# Altium footprint library ref-packages.PCBLIB: 1543 footprints (part 42 of 103)
Each footprint in its own frame and in the unit in brackets; x right, y up, seen from the top. Pads: shape width x height; smd on the part's side, far side on the other; paste and mask are expansions set on the pad; w line width, h text height; cw(c..) or ccw(c..) is an arc to the next point about the centre after c.
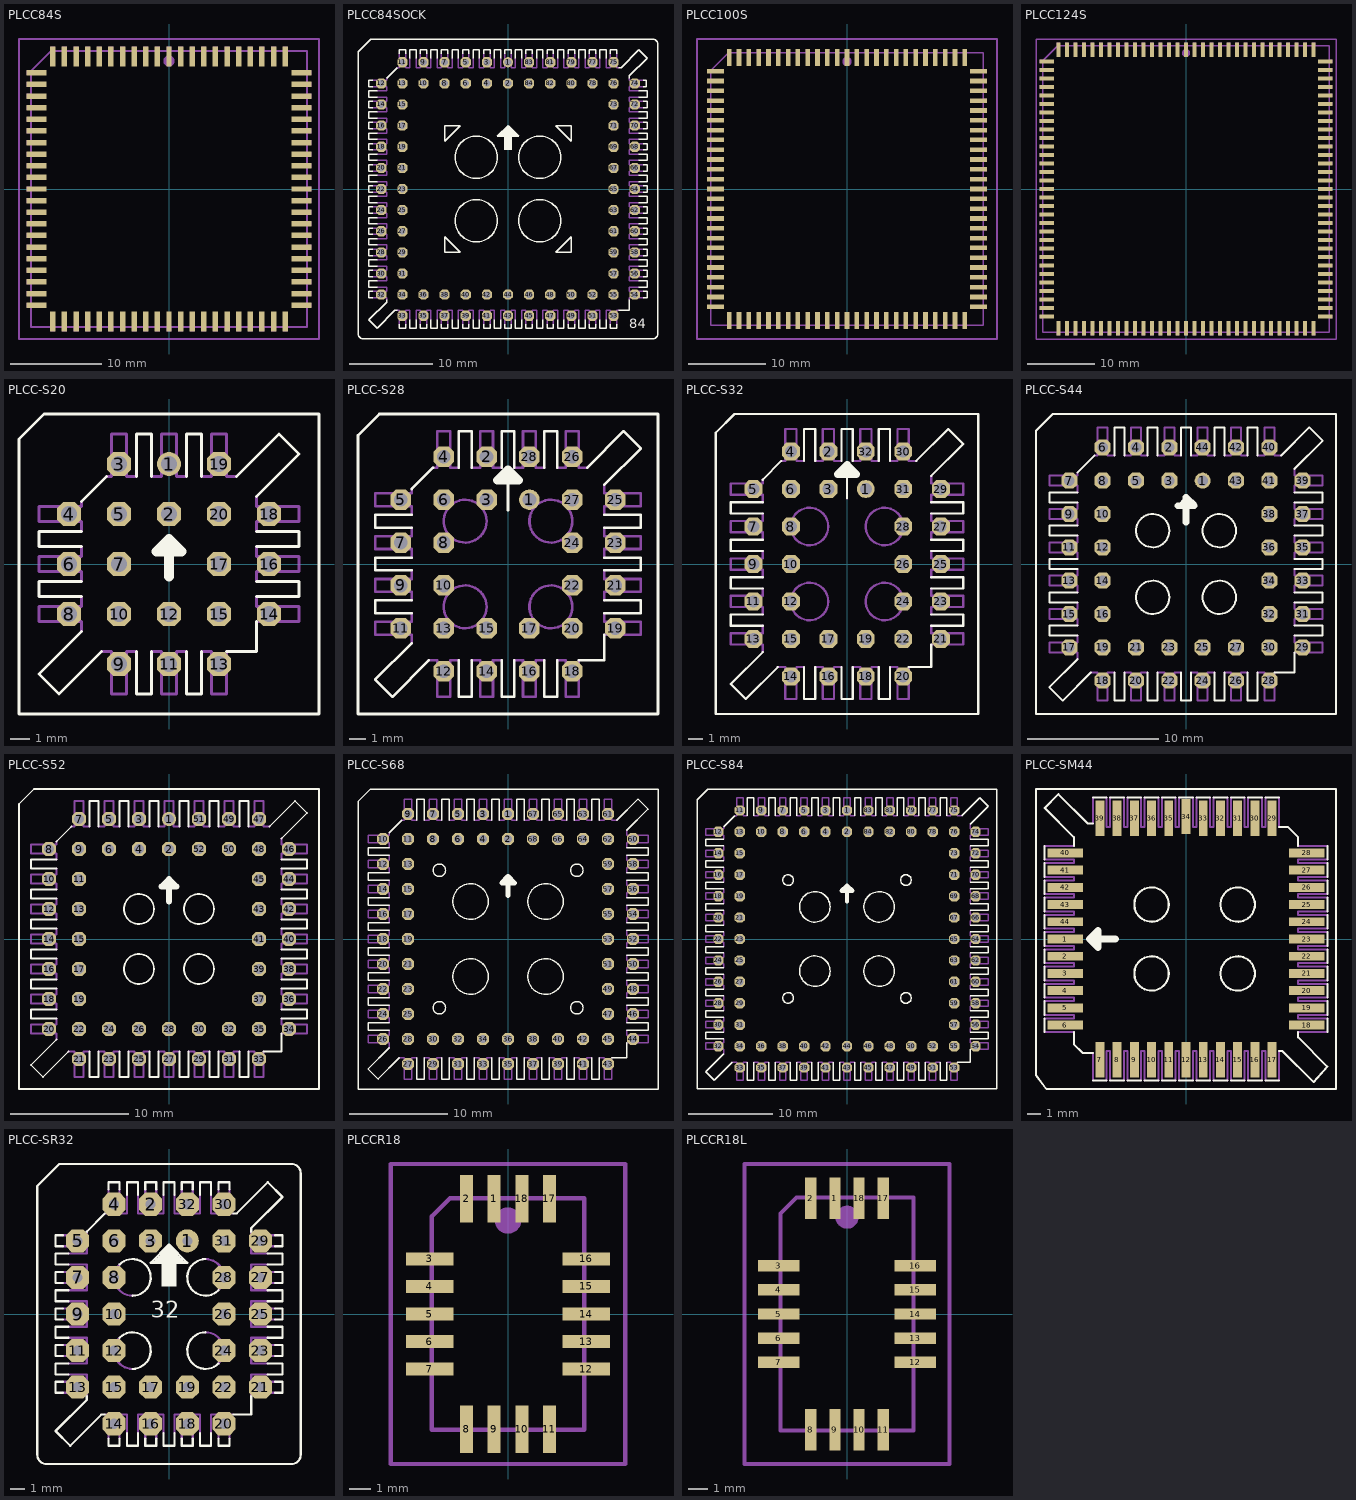
[diagram p41: the footprints below, top view; thin cyan lines are the x and y axes]

## PLCC84S [mil]
pads (84):
  rect 23.62x86.61 smd: 1(0,570.87) 2(-50,570.87) 3(-100,570.87) 4(-150,570.87) 5(-200,570.87) 6(-250,570.87) 7(-300,570.87) 8(-350,570.87) 9(-400,570.87) 10(-450,570.87) 11(-500,570.87) 33(-500,-570.87) 34(-450,-570.87) 35(-400,-570.87) 36(-350,-570.87) 37(-300,-570.87) 38(-250,-570.87) 39(-200,-570.87) 40(-150,-570.87) 41(-100,-570.87) 42(-50,-570.87) 43(0,-570.87) 44(50,-570.87) 45(100,-570.87) 46(150,-570.87) 47(200,-570.87) 48(250,-570.87) 49(300,-570.87) 50(350,-570.87) 51(400,-570.87) 52(450,-570.87) 53(500,-570.87) 75(500,570.87) 76(450,570.87) 77(400,570.87) 78(350,570.87) 79(300,570.87) 80(250,570.87) 81(200,570.87) 82(150,570.87) 83(100,570.87) 84(50,570.87)
  rect 86.61x23.62 smd: 12(-570.87,500) 13(-570.87,450) 14(-570.87,400) 15(-570.87,350) 16(-570.87,300) 17(-570.87,250) 18(-570.87,200) 19(-570.87,150) 20(-570.87,100) 21(-570.87,50) 22(-570.87,0) 23(-570.87,-50) 24(-570.87,-100) 25(-570.87,-150) 26(-570.87,-200) 27(-570.87,-250) 28(-570.87,-300) 29(-570.87,-350) 30(-570.87,-400) 31(-570.87,-450) 32(-570.87,-500) 54(570.87,-500) 55(570.87,-450) 56(570.87,-400) 57(570.87,-350) 58(570.87,-300) 59(570.87,-250) 60(570.87,-200) 61(570.87,-150) 62(570.87,-100) 63(570.87,-50) 64(570.87,0) 65(570.87,50) 66(570.87,100) 67(570.87,150) 68(570.87,200) 69(570.87,250) 70(570.87,300) 71(570.87,350) 72(570.87,400) 73(570.87,450) 74(570.87,500)
Mechanical 16:
  circle w24: c0,551.18 r11.81
  rectangle: -10.24,596.46 10.24,614.17
  rectangle: -60.24,596.46 -39.76,614.17
  rectangle: -110.24,596.46 -89.76,614.17
  rectangle: -160.24,596.46 -139.76,614.17
  rectangle: -210.24,596.46 -189.76,614.17
  rectangle: -260.24,596.46 -239.76,614.17
  rectangle: -310.24,596.46 -289.76,614.17
  rectangle: -360.24,596.46 -339.76,614.17
  rectangle: -410.24,596.46 -389.76,614.17
  rectangle: -460.24,596.46 -439.76,614.17
  rectangle: -510.24,596.46 -489.76,614.17
  rectangle: -614.17,489.76 -596.46,510.24
  rectangle: -614.17,439.76 -596.46,460.24
  rectangle: -614.17,389.76 -596.46,410.24
  rectangle: -614.17,339.76 -596.46,360.24
  rectangle: -614.17,289.76 -596.46,310.24
  rectangle: -614.17,239.76 -596.46,260.24
  rectangle: -614.17,189.76 -596.46,210.24
  rectangle: -614.17,139.76 -596.46,160.24
  rectangle: -614.17,89.76 -596.46,110.24
  rectangle: -614.17,39.76 -596.46,60.24
  rectangle: -614.17,-10.24 -596.46,10.24
  rectangle: -614.17,-60.24 -596.46,-39.76
  rectangle: -614.17,-110.24 -596.46,-89.76
  rectangle: -614.17,-160.24 -596.46,-139.76
  rectangle: -614.17,-210.24 -596.46,-189.76
  rectangle: -614.17,-260.24 -596.46,-239.76
  rectangle: -614.17,-310.24 -596.46,-289.76
  rectangle: -614.17,-360.24 -596.46,-339.76
  rectangle: -614.17,-410.24 -596.46,-389.76
  rectangle: -614.17,-460.24 -596.46,-439.76
  rectangle: -614.17,-510.24 -596.46,-489.76
  rectangle: -510.24,-614.17 -489.76,-596.46
  rectangle: -460.24,-614.17 -439.76,-596.46
  rectangle: -410.24,-614.17 -389.76,-596.46
  rectangle: -360.24,-614.17 -339.76,-596.46
  rectangle: -310.24,-614.17 -289.76,-596.46
  rectangle: -260.24,-614.17 -239.76,-596.46
  rectangle: -210.24,-614.17 -189.76,-596.46
  rectangle: -160.24,-614.17 -139.76,-596.46
  rectangle: -110.24,-614.17 -89.76,-596.46
  rectangle: -60.24,-614.17 -39.76,-596.46
  rectangle: -10.24,-614.17 10.24,-596.46
  rectangle: 39.76,-614.17 60.24,-596.46
  rectangle: 89.76,-614.17 110.24,-596.46
  rectangle: 139.76,-614.17 160.24,-596.46
  rectangle: 189.76,-614.17 210.24,-596.46
  rectangle: 239.76,-614.17 260.24,-596.46
  rectangle: 289.76,-614.17 310.24,-596.46
  rectangle: 339.76,-614.17 360.24,-596.46
  rectangle: 389.76,-614.17 410.24,-596.46
  rectangle: 439.76,-614.17 460.24,-596.46
  rectangle: 489.76,-614.17 510.24,-596.46
  rectangle: 596.46,-510.24 614.17,-489.76
  rectangle: 596.46,-460.24 614.17,-439.76
  rectangle: 596.46,-410.24 614.17,-389.76
  rectangle: 596.46,-360.24 614.17,-339.76
  rectangle: 596.46,-310.24 614.17,-289.76
  rectangle: 596.46,-260.24 614.17,-239.76
  rectangle: 596.46,-210.24 614.17,-189.76
  rectangle: 596.46,-160.24 614.17,-139.76
  rectangle: 596.46,-110.24 614.17,-89.76
  rectangle: 596.46,-60.24 614.17,-39.76
  rectangle: 596.46,-10.24 614.17,10.24
  rectangle: 596.46,39.76 614.17,60.24
  rectangle: 596.46,89.76 614.17,110.24
  rectangle: 596.46,139.76 614.17,160.24
  rectangle: 596.46,189.76 614.17,210.24
  rectangle: 596.46,239.76 614.17,260.24
  rectangle: 596.46,289.76 614.17,310.24
  rectangle: 596.46,339.76 614.17,360.24
  rectangle: 596.46,389.76 614.17,410.24
  rectangle: 596.46,439.76 614.17,460.24
  rectangle: 596.46,489.76 614.17,510.24
  rectangle: 489.76,596.46 510.24,614.17
  rectangle: 439.76,596.46 460.24,614.17
  rectangle: 389.76,596.46 410.24,614.17
  rectangle: 339.76,596.46 360.24,614.17
  rectangle: 289.76,596.46 310.24,614.17
  rectangle: 239.76,596.46 260.24,614.17
  rectangle: 189.76,596.46 210.24,614.17
  rectangle: 139.76,596.46 160.24,614.17
  rectangle: 89.76,596.46 110.24,614.17
  rectangle: 39.76,596.46 60.24,614.17
  lines w8: -594.49,-594.49 -594.49,506.5 -506.5,594.49 594.49,594.49 594.49,-594.49 -594.49,-594.49
Mechanical 27:
  lines w7.87: -645.79,-645.79 645.79,-645.79 645.79,645.79 -645.79,645.79 -645.79,-645.79

## PLCC84SOCK [mil]
pads (84):
  round 48 hole 32: 1(0,600)
  oct 48x48 hole 32: 2(0,500) 3(-100,600) 4(-100,500) 5(-200,600) 6(-200,500) 7(-300,600) 8(-300,500) 9(-400,600) 10(-400,500) 11(-500,600) 12(-600,500) 13(-500,500) 14(-600,400) 15(-500,400) 16(-600,300) 17(-500,300) 18(-600,200) 19(-500,200) 20(-600,100) 21(-500,100) 22(-600,0) 23(-500,0) 24(-600,-100) 25(-500,-100) 26(-600,-200) 27(-500,-200) 28(-600,-300) 29(-500,-300) 30(-600,-400) 31(-500,-400) 32(-600,-500) 33(-500,-600) 34(-500,-500) 35(-400,-600) 36(-400,-500) 37(-300,-600) 38(-300,-500) 39(-200,-600) 40(-200,-500) 41(-100,-600) 42(-100,-500) 43(0,-600) 44(0,-500) 45(100,-600) 46(100,-500) 47(200,-600) 48(200,-500) 49(300,-600) 50(300,-500) 51(400,-600) 52(400,-500) 53(500,-600) 54(600,-500) 55(500,-500) 56(600,-400) 57(500,-400) 58(600,-300) 59(500,-300) 60(600,-200) 61(500,-200) 62(600,-100) 63(500,-100) 64(600,0) 65(500,0) 66(600,100) 67(500,100) 68(600,200) 69(500,200) 70(600,300) 71(500,300) 72(600,400) 73(500,400) 74(600,500) 75(500,600) 76(500,500) 77(400,600) 78(400,500) 79(300,600) 80(300,500) 81(200,600) 82(200,500) 83(100,600) 84(100,500)
Top Overlay:
  drawing of 307 lines, arcs and shapes, not listed
  text "84" at 575,-675 h77.5
Mechanical 16:
  drawing of 256 lines, arcs and shapes, not listed

## PLCC100S [mil]
pads (100):
  rect 23.62x86.61 smd: 1(0,669.29) 2(-50,669.29) 3(-100,669.29) 4(-150,669.29) 5(-200,669.29) 6(-250,669.29) 7(-300,669.29) 8(-350,669.29) 9(-400,669.29) 10(-450,669.29) 11(-500,669.29) 12(-550,669.29) 13(-600,669.29) 39(-600,-669.29) 40(-550,-669.29) 41(-500,-669.29) 42(-450,-669.29) 43(-400,-669.29) 44(-350,-669.29) 45(-300,-669.29) 46(-250,-669.29) 47(-200,-669.29) 48(-150,-669.29) 49(-100,-669.29) 50(-50,-669.29) 51(0,-669.29) 52(50,-669.29) 53(100,-669.29) 54(150,-669.29) 55(200,-669.29) 56(250,-669.29) 57(300,-669.29) 58(350,-669.29) 59(400,-669.29) 60(450,-669.29) 61(500,-669.29) 62(550,-669.29) 63(600,-669.29) 89(600,669.29) 90(550,669.29) 91(500,669.29) 92(450,669.29) 93(400,669.29) 94(350,669.29) 95(300,669.29) 96(250,669.29) 97(200,669.29) 98(150,669.29) 99(100,669.29) 100(50,669.29)
  rect 86.61x23.62 smd: 14(-669.29,600) 15(-669.29,550) 16(-669.29,500) 17(-669.29,450) 18(-669.29,400) 19(-669.29,350) 20(-669.29,300) 21(-669.29,250) 22(-669.29,200) 23(-669.29,150) 24(-669.29,100) 25(-669.29,50) 26(-669.29,0) 27(-669.29,-50) 28(-669.29,-100) 29(-669.29,-150) 30(-669.29,-200) 31(-669.29,-250) 32(-669.29,-300) 33(-669.29,-350) 34(-669.29,-400) 35(-669.29,-450) 36(-669.29,-500) 37(-669.29,-550) 38(-669.29,-600) 64(669.29,-600) 65(669.29,-550) 66(669.29,-500) 67(669.29,-450) 68(669.29,-400) 69(669.29,-350) 70(669.29,-300) 71(669.29,-250) 72(669.29,-200) 73(669.29,-150) 74(669.29,-100) 75(669.29,-50) 76(669.29,0) 77(669.29,50) 78(669.29,100) 79(669.29,150) 80(669.29,200) 81(669.29,250) 82(669.29,300) 83(669.29,350) 84(669.29,400) 85(669.29,450) 86(669.29,500) 87(669.29,550) 88(669.29,600)
Mechanical 16:
  circle w24: c0,649.61 r11.81
  rectangle: -10.24,694.88 10.24,712.6
  rectangle: -60.24,694.88 -39.76,712.6
  rectangle: -110.24,694.88 -89.76,712.6
  rectangle: -160.24,694.88 -139.76,712.6
  rectangle: -210.24,694.88 -189.76,712.6
  rectangle: -260.24,694.88 -239.76,712.6
  rectangle: -310.24,694.88 -289.76,712.6
  rectangle: -360.24,694.88 -339.76,712.6
  rectangle: -410.24,694.88 -389.76,712.6
  rectangle: -460.24,694.88 -439.76,712.6
  rectangle: -510.24,694.88 -489.76,712.6
  rectangle: -560.24,694.88 -539.76,712.6
  rectangle: -610.24,694.88 -589.76,712.6
  rectangle: -712.6,589.76 -694.88,610.24
  rectangle: -712.6,539.76 -694.88,560.24
  rectangle: -712.6,489.76 -694.88,510.24
  rectangle: -712.6,439.76 -694.88,460.24
  rectangle: -712.6,389.76 -694.88,410.24
  rectangle: -712.6,339.76 -694.88,360.24
  rectangle: -712.6,289.76 -694.88,310.24
  rectangle: -712.6,239.76 -694.88,260.24
  rectangle: -712.6,189.76 -694.88,210.24
  rectangle: -712.6,139.76 -694.88,160.24
  rectangle: -712.6,89.76 -694.88,110.24
  rectangle: -712.6,39.76 -694.88,60.24
  rectangle: -712.6,-10.24 -694.88,10.24
  rectangle: -712.6,-60.24 -694.88,-39.76
  rectangle: -712.6,-110.24 -694.88,-89.76
  rectangle: -712.6,-160.24 -694.88,-139.76
  rectangle: -712.6,-210.24 -694.88,-189.76
  rectangle: -712.6,-260.24 -694.88,-239.76
  rectangle: -712.6,-310.24 -694.88,-289.76
  rectangle: -712.6,-360.24 -694.88,-339.76
  rectangle: -712.6,-410.24 -694.88,-389.76
  rectangle: -712.6,-460.24 -694.88,-439.76
  rectangle: -712.6,-510.24 -694.88,-489.76
  rectangle: -712.6,-560.24 -694.88,-539.76
  rectangle: -712.6,-610.24 -694.88,-589.76
  rectangle: -610.24,-712.6 -589.76,-694.88
  rectangle: -560.24,-712.6 -539.76,-694.88
  rectangle: -510.24,-712.6 -489.76,-694.88
  rectangle: -460.24,-712.6 -439.76,-694.88
  rectangle: -410.24,-712.6 -389.76,-694.88
  rectangle: -360.24,-712.6 -339.76,-694.88
  rectangle: -310.24,-712.6 -289.76,-694.88
  rectangle: -260.24,-712.6 -239.76,-694.88
  rectangle: -210.24,-712.6 -189.76,-694.88
  rectangle: -160.24,-712.6 -139.76,-694.88
  rectangle: -110.24,-712.6 -89.76,-694.88
  rectangle: -60.24,-712.6 -39.76,-694.88
  rectangle: -10.24,-712.6 10.24,-694.88
  rectangle: 39.76,-712.6 60.24,-694.88
  rectangle: 89.76,-712.6 110.24,-694.88
  rectangle: 139.76,-712.6 160.24,-694.88
  rectangle: 189.76,-712.6 210.24,-694.88
  rectangle: 239.76,-712.6 260.24,-694.88
  rectangle: 289.76,-712.6 310.24,-694.88
  rectangle: 339.76,-712.6 360.24,-694.88
  rectangle: 389.76,-712.6 410.24,-694.88
  rectangle: 439.76,-712.6 460.24,-694.88
  rectangle: 489.76,-712.6 510.24,-694.88
  rectangle: 539.76,-712.6 560.24,-694.88
  rectangle: 589.76,-712.6 610.24,-694.88
  rectangle: 694.88,-610.24 712.6,-589.76
  rectangle: 694.88,-560.24 712.6,-539.76
  rectangle: 694.88,-510.24 712.6,-489.76
  rectangle: 694.88,-460.24 712.6,-439.76
  rectangle: 694.88,-410.24 712.6,-389.76
  rectangle: 694.88,-360.24 712.6,-339.76
  rectangle: 694.88,-310.24 712.6,-289.76
  rectangle: 694.88,-260.24 712.6,-239.76
  rectangle: 694.88,-210.24 712.6,-189.76
  rectangle: 694.88,-160.24 712.6,-139.76
  rectangle: 694.88,-110.24 712.6,-89.76
  rectangle: 694.88,-60.24 712.6,-39.76
  rectangle: 694.88,-10.24 712.6,10.24
  rectangle: 694.88,39.76 712.6,60.24
  rectangle: 694.88,89.76 712.6,110.24
  rectangle: 694.88,139.76 712.6,160.24
  rectangle: 694.88,189.76 712.6,210.24
  rectangle: 694.88,239.76 712.6,260.24
  rectangle: 694.88,289.76 712.6,310.24
  rectangle: 694.88,339.76 712.6,360.24
  rectangle: 694.88,389.76 712.6,410.24
  rectangle: 694.88,439.76 712.6,460.24
  rectangle: 694.88,489.76 712.6,510.24
  rectangle: 694.88,539.76 712.6,560.24
  rectangle: 694.88,589.76 712.6,610.24
  rectangle: 589.76,694.88 610.24,712.6
  rectangle: 539.76,694.88 560.24,712.6
  rectangle: 489.76,694.88 510.24,712.6
  rectangle: 439.76,694.88 460.24,712.6
  rectangle: 389.76,694.88 410.24,712.6
  rectangle: 339.76,694.88 360.24,712.6
  rectangle: 289.76,694.88 310.24,712.6
  rectangle: 239.76,694.88 260.24,712.6
  rectangle: 189.76,694.88 210.24,712.6
  rectangle: 139.76,694.88 160.24,712.6
  rectangle: 89.76,694.88 110.24,712.6
  rectangle: 39.76,694.88 60.24,712.6
  lines w8: -692.91,-692.91 -692.91,604.92 -604.92,692.91 692.91,692.91 692.91,-692.91 -692.91,-692.91
Mechanical 27:
  lines w7.87: -763.9,-763.9 763.9,-763.9 763.9,763.9 -763.9,763.9 -763.9,-763.9

## PLCC124S [mil]
pads (124):
  rect 23.62x86.61 smd: 1(0,818.9) 2(-50,818.9) 3(-100,818.9) 4(-150,818.9) 5(-200,818.9) 6(-250,818.9) 7(-300,818.9) 8(-350,818.9) 9(-400,818.9) 10(-450,818.9) 11(-500,818.9) 12(-550,818.9) 13(-600,818.9) 14(-650,818.9) 15(-700,818.9) 16(-750,818.9) 48(-750,-818.9) 49(-700,-818.9) 50(-650,-818.9) 51(-600,-818.9) 52(-550,-818.9) 53(-500,-818.9) 54(-450,-818.9) 55(-400,-818.9) 56(-350,-818.9) 57(-300,-818.9) 58(-250,-818.9) 59(-200,-818.9) 60(-150,-818.9) 61(-100,-818.9) 62(-50,-818.9) 63(0,-818.9) 64(50,-818.9) 65(100,-818.9) 66(150,-818.9) 67(200,-818.9) 68(250,-818.9) 69(300,-818.9) 70(350,-818.9) 71(400,-818.9) 72(450,-818.9) 73(500,-818.9) 74(550,-818.9) 75(600,-818.9) 76(650,-818.9) 77(700,-818.9) 78(750,-818.9) 110(750,818.9) 111(700,818.9) 112(650,818.9) 113(600,818.9) 114(550,818.9) 115(500,818.9) 116(450,818.9) 117(400,818.9) 118(350,818.9) 119(300,818.9) 120(250,818.9) 121(200,818.9) 122(150,818.9) 123(100,818.9) 124(50,818.9)
  rect 86.61x23.62 smd: 17(-818.9,750) 18(-818.9,700) 19(-818.9,650) 20(-818.9,600) 21(-818.9,550) 22(-818.9,500) 23(-818.9,450) 24(-818.9,400) 25(-818.9,350) 26(-818.9,300) 27(-818.9,250) 28(-818.9,200) 29(-818.9,150) 30(-818.9,100) 31(-818.9,50) 32(-818.9,0) 33(-818.9,-50) 34(-818.9,-100) 35(-818.9,-150) 36(-818.9,-200) 37(-818.9,-250) 38(-818.9,-300) 39(-818.9,-350) 40(-818.9,-400) 41(-818.9,-450) 42(-818.9,-500) 43(-818.9,-550) 44(-818.9,-600) 45(-818.9,-650) 46(-818.9,-700) 47(-818.9,-750) 79(818.9,-750) 80(818.9,-700) 81(818.9,-650) 82(818.9,-600) 83(818.9,-550) 84(818.9,-500) 85(818.9,-450) 86(818.9,-400) 87(818.9,-350) 88(818.9,-300) 89(818.9,-250) 90(818.9,-200) 91(818.9,-150) 92(818.9,-100) 93(818.9,-50) 94(818.9,0) 95(818.9,50) 96(818.9,100) 97(818.9,150) 98(818.9,200) 99(818.9,250) 100(818.9,300) 101(818.9,350) 102(818.9,400) 103(818.9,450) 104(818.9,500) 105(818.9,550) 106(818.9,600) 107(818.9,650) 108(818.9,700) 109(818.9,750)
Mechanical 16:
  circle w24: c0,799.21 r11.81
  rectangle: -10.24,844.49 10.24,862.2
  rectangle: -60.24,844.49 -39.76,862.2
  rectangle: -110.24,844.49 -89.76,862.2
  rectangle: -160.24,844.49 -139.76,862.2
  rectangle: -210.24,844.49 -189.76,862.2
  rectangle: -260.24,844.49 -239.76,862.2
  rectangle: -310.24,844.49 -289.76,862.2
  rectangle: -360.24,844.49 -339.76,862.2
  rectangle: -410.24,844.49 -389.76,862.2
  rectangle: -460.24,844.49 -439.76,862.2
  rectangle: -510.24,844.49 -489.76,862.2
  rectangle: -560.24,844.49 -539.76,862.2
  rectangle: -610.24,844.49 -589.76,862.2
  rectangle: -660.24,844.49 -639.76,862.2
  rectangle: -710.24,844.49 -689.76,862.2
  rectangle: -760.24,844.49 -739.76,862.2
  rectangle: -862.2,739.76 -844.49,760.24
  rectangle: -862.2,689.76 -844.49,710.24
  rectangle: -862.2,639.76 -844.49,660.24
  rectangle: -862.2,589.76 -844.49,610.24
  rectangle: -862.2,539.76 -844.49,560.24
  rectangle: -862.2,489.76 -844.49,510.24
  rectangle: -862.2,439.76 -844.49,460.24
  rectangle: -862.2,389.76 -844.49,410.24
  rectangle: -862.2,339.76 -844.49,360.24
  rectangle: -862.2,289.76 -844.49,310.24
  rectangle: -862.2,239.76 -844.49,260.24
  rectangle: -862.2,189.76 -844.49,210.24
  rectangle: -862.2,139.76 -844.49,160.24
  rectangle: -862.2,89.76 -844.49,110.24
  rectangle: -862.2,39.76 -844.49,60.24
  rectangle: -862.2,-10.24 -844.49,10.24
  rectangle: -862.2,-60.24 -844.49,-39.76
  rectangle: -862.2,-110.24 -844.49,-89.76
  rectangle: -862.2,-160.24 -844.49,-139.76
  rectangle: -862.2,-210.24 -844.49,-189.76
  rectangle: -862.2,-260.24 -844.49,-239.76
  rectangle: -862.2,-310.24 -844.49,-289.76
  rectangle: -862.2,-360.24 -844.49,-339.76
  rectangle: -862.2,-410.24 -844.49,-389.76
  rectangle: -862.2,-460.24 -844.49,-439.76
  rectangle: -862.2,-510.24 -844.49,-489.76
  rectangle: -862.2,-560.24 -844.49,-539.76
  rectangle: -862.2,-610.24 -844.49,-589.76
  rectangle: -862.2,-660.24 -844.49,-639.76
  rectangle: -862.2,-710.24 -844.49,-689.76
  rectangle: -862.2,-760.24 -844.49,-739.76
  rectangle: -760.24,-862.2 -739.76,-844.49
  rectangle: -710.24,-862.2 -689.76,-844.49
  rectangle: -660.24,-862.2 -639.76,-844.49
  rectangle: -610.24,-862.2 -589.76,-844.49
  rectangle: -560.24,-862.2 -539.76,-844.49
  rectangle: -510.24,-862.2 -489.76,-844.49
  rectangle: -460.24,-862.2 -439.76,-844.49
  rectangle: -410.24,-862.2 -389.76,-844.49
  rectangle: -360.24,-862.2 -339.76,-844.49
  rectangle: -310.24,-862.2 -289.76,-844.49
  rectangle: -260.24,-862.2 -239.76,-844.49
  rectangle: -210.24,-862.2 -189.76,-844.49
  rectangle: -160.24,-862.2 -139.76,-844.49
  rectangle: -110.24,-862.2 -89.76,-844.49
  rectangle: -60.24,-862.2 -39.76,-844.49
  rectangle: -10.24,-862.2 10.24,-844.49
  rectangle: 39.76,-862.2 60.24,-844.49
  rectangle: 89.76,-862.2 110.24,-844.49
  rectangle: 139.76,-862.2 160.24,-844.49
  rectangle: 189.76,-862.2 210.24,-844.49
  rectangle: 239.76,-862.2 260.24,-844.49
  rectangle: 289.76,-862.2 310.24,-844.49
  rectangle: 339.76,-862.2 360.24,-844.49
  rectangle: 389.76,-862.2 410.24,-844.49
  rectangle: 439.76,-862.2 460.24,-844.49
  rectangle: 489.76,-862.2 510.24,-844.49
  rectangle: 539.76,-862.2 560.24,-844.49
  rectangle: 589.76,-862.2 610.24,-844.49
  rectangle: 639.76,-862.2 660.24,-844.49
  rectangle: 689.76,-862.2 710.24,-844.49
  rectangle: 739.76,-862.2 760.24,-844.49
  rectangle: 844.49,-760.24 862.2,-739.76
  rectangle: 844.49,-710.24 862.2,-689.76
  rectangle: 844.49,-660.24 862.2,-639.76
  rectangle: 844.49,-610.24 862.2,-589.76
  rectangle: 844.49,-560.24 862.2,-539.76
  rectangle: 844.49,-510.24 862.2,-489.76
  rectangle: 844.49,-460.24 862.2,-439.76
  rectangle: 844.49,-410.24 862.2,-389.76
  rectangle: 844.49,-360.24 862.2,-339.76
  rectangle: 844.49,-310.24 862.2,-289.76
  rectangle: 844.49,-260.24 862.2,-239.76
  rectangle: 844.49,-210.24 862.2,-189.76
  rectangle: 844.49,-160.24 862.2,-139.76
  rectangle: 844.49,-110.24 862.2,-89.76
  rectangle: 844.49,-60.24 862.2,-39.76
  rectangle: 844.49,-10.24 862.2,10.24
  rectangle: 844.49,39.76 862.2,60.24
  rectangle: 844.49,89.76 862.2,110.24
  rectangle: 844.49,139.76 862.2,160.24
  rectangle: 844.49,189.76 862.2,210.24
  rectangle: 844.49,239.76 862.2,260.24
  rectangle: 844.49,289.76 862.2,310.24
  rectangle: 844.49,339.76 862.2,360.24
  rectangle: 844.49,389.76 862.2,410.24
  rectangle: 844.49,439.76 862.2,460.24
  rectangle: 844.49,489.76 862.2,510.24
  rectangle: 844.49,539.76 862.2,560.24
  rectangle: 844.49,589.76 862.2,610.24
  rectangle: 844.49,639.76 862.2,660.24
  rectangle: 844.49,689.76 862.2,710.24
  rectangle: 844.49,739.76 862.2,760.24
  rectangle: 739.76,844.49 760.24,862.2
  rectangle: 689.76,844.49 710.24,862.2
  rectangle: 639.76,844.49 660.24,862.2
  rectangle: 589.76,844.49 610.24,862.2
  rectangle: 539.76,844.49 560.24,862.2
  rectangle: 489.76,844.49 510.24,862.2
  rectangle: 439.76,844.49 460.24,862.2
  rectangle: 389.76,844.49 410.24,862.2
  rectangle: 339.76,844.49 360.24,862.2
  rectangle: 289.76,844.49 310.24,862.2
  rectangle: 239.76,844.49 260.24,862.2
  rectangle: 189.76,844.49 210.24,862.2
  rectangle: 139.76,844.49 160.24,862.2
  rectangle: 89.76,844.49 110.24,862.2
  rectangle: 39.76,844.49 60.24,862.2
  lines w8: -842.52,-842.52 -842.52,754.53 -754.53,842.52 842.52,842.52 842.52,-842.52 -842.52,-842.52
Mechanical 27:
  lines w7.87: -882.01,-882.01 882.01,-882.01 882.01,882.01 -882.01,882.01 -882.01,-882.01

## PLCC-S20 [mil]
pads (20):
  round 48 hole 32: 1(0,200)
  oct 48x48 hole 32: 2(0,100) 3(-100,200) 4(-200,100) 5(-100,100) 6(-200,0) 7(-100,0) 8(-200,-100) 9(-100,-200) 10(-100,-100) 11(0,-200) 12(0,-100) 13(100,-200) 14(200,-100) 15(100,-100) 16(200,0) 17(100,0) 18(200,100) 19(100,200) 20(100,100)
Top Overlay:
  lines w6: -175,-135 -260,-220 -220,-260 -135,-175 ; -175,-65 -260,-65 -260,-35 -175,-35 ; -175,35 -260,35 -260,65 -175,65 ; -175,125 -125,175 ; -65,-175 -65,-260 -35,-260 -35,-175 ; -65,175 -65,260 -35,260 -35,175 ; 35,-175 35,-260 65,-260 65,-175 ; 35,175 35,260 65,260 65,175 ; 115,-175 175,-175 175,-115 ; 135,175 220,260 260,220 175,135 ; 175,-65 260,-65 260,-35 175,-35 ; 175,35 260,35 260,65 175,65 ; -300,-300 -300,250 -250,300 300,300 300,-300 -300,-300
  lines w20: 0,-25 0,50 ; 0,50 25,25 -25,25 0,50
Mechanical 16:
  lines w6: -175,-135 -175,-115 -260,-115 -260,-85 -175,-85 -175,-65 ; -175,-35 -175,-15 -260,-15 -260,15 -175,15 -175,35 ; -175,65 -175,85 -260,85 -260,115 -175,115 -175,125 ; -135,-175 -115,-175 -115,-260 -85,-260 -85,-175 -65,-175 ; -125,175 -115,175 -115,260 -85,260 -85,175 -65,175 ; -35,-175 -15,-175 -15,-260 15,-260 15,-175 35,-175 ; -35,175 -15,175 -15,260 15,260 15,175 35,175 ; 65,-175 85,-175 85,-260 115,-260 115,-175 ; 65,175 85,175 85,260 115,260 115,175 135,175 ; 175,-115 260,-115 260,-85 175,-85 175,-65 ; 175,-35 175,-15 260,-15 260,15 175,15 175,35 ; 175,65 175,85 260,85 260,115 175,115 175,135
